# Altium footprint library ThanhNT.PcbLib: 579 footprints (part 2 of 37)
Each footprint in its own frame and in the unit in brackets; x right, y up, seen from the top. Pads: shape width x height; smd on the part's side, far side on the other; paste and mask are expansions set on the pad; w line width, h text height; cw(c..) or ccw(c..) is an arc to the next point about the centre after c.
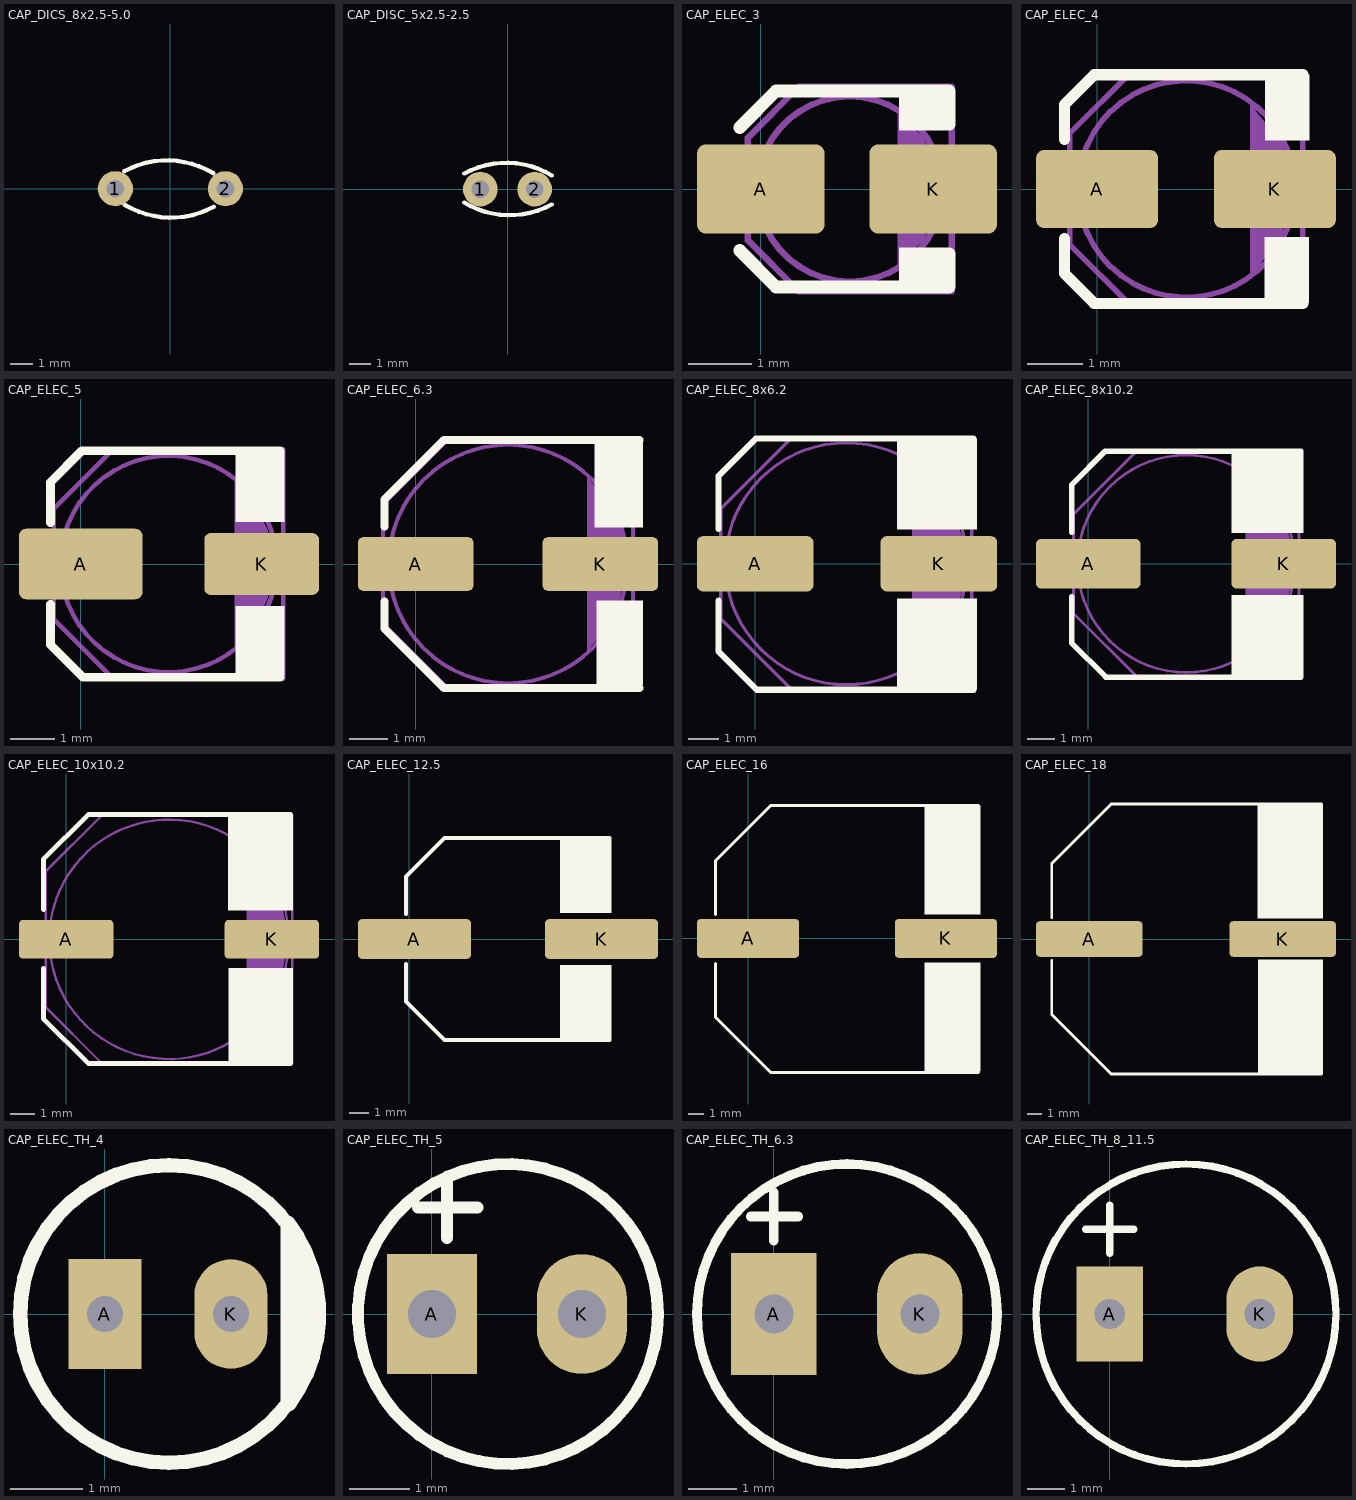
[diagram p1: the footprints below, top view; thin cyan lines are the x and y axes]

## CAP_DICS_8x2.5-5.0 [mm] "C Disc 5x2.5-5.0"
height 11
pads (2):
  round 1.6 hole 0.8: 1(-2.5,0) 2(2.5,0)
Top Overlay:
  lines w0.2: -2.088,0.796 cw(c-0.152,-2.769) 1.942,0.705 ; -2.069,-0.731 ccw(c0.025,2.743) 1.961,-0.822
3D body "User Library-Cer-Cap2_5 (5x1_5).STEP": height 2.24, standoff -5.76, extent -2.919,-1.566 2.868,1.618

## CAP_DISC_5x2.5-2.5 [mm] "C Disc 5x2.5-2.5"
height 5
pads (2):
  round 1.6 hole 0.8: 1(-1.25,0) 2(1.25,0)
Top Overlay:
  lines w0.2: -1.998,-0.62 ccw(c0.097,2.854) 2.032,-0.711 ; -1.986,0.72 cw(c-0.051,-2.845) 2.044,0.629
3D body "User Library-Cer-Cap2 (3_5x1_5).STEP": height 4.26, standoff -2.24, extent -1.905,-0.992 1.803,1.094

## CAP_ELEC_3 [mm] "Aluminum Cap SMD (Code A: 3mm)"
height 2.54
pads (2):
  rrect20% 2x1.4 smd: A(0,0) K(2.7,0)
Top Overlay:
  region: 2.962,-0.914 2.162,-0.914 2.162,-1.535 2.962,-1.535
  region: 2.962,1.535 2.162,1.535 2.162,0.914 2.962,0.914
  lines w0.2: -0.33,-0.965 0.239,-1.535 2.946,-1.535 2.946,-1.016 ; -0.33,0.965 0.239,1.535 2.946,1.535 2.946,1.016
Mechanical 16:
  circle w0.102: c1.393,0 r1.45
  region: -0.057,0.3 -0.407,0.3 -0.407,-0.3 -0.057,-0.3
  region: 3.193,0.3 2.843,0.3 2.843,-0.3 3.193,-0.3
  region: 2.243,-1.1 2.543,-0.8 2.743,-0.3 2.743,0.3 2.543,0.8 2.243,1.1 2.243,-1.05
  lines w0.102: 2.193,-1.2 2.193,1.2 ; -0.207,-0.8 -0.207,0.8 0.593,1.6 2.993,1.6 2.993,-1.6 0.593,-1.6 -0.207,-0.8

## CAP_ELEC_4 [mm] "Aluminum Cap SMD (Code B: 4mm)"
height 2.54
pads (2):
  rrect20% 2.2x1.4 smd: A(0,0) K(3.2,0)
Top Overlay:
  region: 3.823,2.057 3.023,2.057 3.023,0.873 3.823,0.873
  region: 3.81,-0.864 3.01,-0.864 3.01,-2.048 3.81,-2.048
  lines w0.2: -0.584,-0.889 -0.584,-1.524 -0.051,-2.057 3.708,-2.057 ; -0.584,0.889 -0.584,1.524 -0.051,2.057 -0.025,2.057 3.708,2.057
Mechanical 16:
  circle w0.102: c1.605,0 r1.95
  region: -0.295,0.35 -0.695,0.35 -0.695,-0.35 -0.295,-0.35
  region: 3.904,0.35 3.454,0.35 3.454,-0.35 3.904,-0.35
  region: 2.854,-1.45 3.305,-0.85 3.454,-0.35 3.454,0.4 3.305,0.85 2.854,1.4 2.854,-1.4
  lines w0.102: 2.804,-1.5 2.804,1.501 ; -0.496,-1 -0.496,1 0.605,2.1 3.705,2.1 3.705,-2.1 0.605,-2.1 -0.496,-1
3D body "User Library-SMD Polymer Aluminum Electrolytic Capacitors A5 10uF 10V.STEP": height 5.4, standoff -0.05, extent -0.9,-2.15 4.1,2.15

## CAP_ELEC_5 [mm] "Aluminum Cap SMD (Code C: 5mm)"
height 2.54
pads (2):
  rrect20% 2.8x1.6 smd: A(0,0)
  rrect20% 2.6x1.4 smd: K(4.1,0)
Top Overlay:
  region: 4.623,2.54 3.508,2.54 3.508,0.949 4.623,0.949
  region: 4.623,-0.949 3.508,-0.949 3.508,-2.515 4.623,-2.515
  lines w0.2: -0.686,-0.914 -0.686,-1.829 0.051,-2.565 4.521,-2.565 ; -0.686,0.94 -0.686,1.854 0.025,2.565 4.521,2.565
Mechanical 16:
  circle w0.102: c1.989,0 r2.45
  region: 4.939,0.35 4.389,0.35 4.389,-0.35 4.939,-0.35
  region: -0.411,0.35 -0.961,0.35 -0.961,-0.35 -0.411,-0.35
  region: 3.589,-1.8 3.989,-1.35 4.238,-0.75 4.439,-0.05 4.238,0.75 3.939,1.35 3.589,1.8
  lines w0.102: 3.538,-1.85 3.538,1.85 ; -0.611,-1.25 0.739,-2.6 4.589,-2.6 4.589,2.6 0.739,2.6 -0.611,1.25 -0.611,-1.25
3D body "User Library-SMD Polymer Aluminum Electrolytic Capacitors B6 33uF 10V.STEP": height 5.9, standoff -0.05, extent -0.993,-2.65 5.007,2.65

## CAP_ELEC_6.3 [mm] "Aluminum Cap SMD (Code D: 6.3mm)"
height 2.54
pads (2):
  rrect20% 3x1.4 smd: A(0,0) K(4.8,0)
Top Overlay:
  region: 5.908,-0.949 4.699,-0.949 4.699,-3.15 5.908,-3.15
  region: 5.908,3.2 4.648,3.2 4.648,0.949 5.908,0.949
  lines w0.2: -0.813,-0.965 -0.813,-1.676 0.737,-3.226 5.817,-3.226 ; -0.813,0.965 -0.813,1.676 0.737,3.226 5.817,3.226
Mechanical 16:
  circle w0.102: c2.401,0 r3.1
  region: -0.649,0.35 -1.249,0.35 -1.249,-0.35 -0.649,-0.35
  region: 6.051,0.35 5.451,0.35 5.451,-0.35 6.051,-0.35
  region: 4.551,-2.15 5,-1.6 5.3,-0.9 5.451,0 5.3,0.95 4.95,1.65 4.551,2.15 4.551,-2.1
  lines w0.102: 4.501,-2.25 4.501,2.2 ; -0.849,-1.55 -0.849,1.55 0.851,3.25 5.65,3.25 5.65,-3.25 0.851,-3.25 -0.849,-1.55
3D body "User Library-SMD Polymer Aluminum Electrolytic Capacitors C6 47uF 10V.STEP": height 5.9, standoff -0.05, extent -1.262,-3.3 6.038,3.3

## CAP_ELEC_8x6.2 [mm] "Aluminum Cap SMD (Code E: 8mm x 6.2mm)"
height 2.54
pads (2):
  rrect20% 3.8x1.8 smd: A(0,0) K(6,0)
Top Overlay:
  region: 7.239,4.089 4.626,4.089 4.626,1.118 7.239,1.118
  region: 7.239,-1.127 4.626,-1.127 4.626,-4.115 7.239,-4.115
  lines w0.2: -1.194,-1.194 -1.194,-2.87 0.051,-4.115 7.137,-4.115 ; -1.194,1.143 -1.194,2.87 0.025,4.089 7.137,4.089
Mechanical 16:
  circle w0.102: c2.975,0 r3.95
  region: 7.475,0.35 6.775,0.35 6.775,-0.35 7.475,-0.35
  region: -0.826,0.35 -1.526,0.35 -1.526,-0.35 -0.826,-0.35
  region: 5.225,-3.2 5.975,-2.5 6.575,-1.5 6.824,-0.65 6.824,0.65 6.524,1.6 5.925,2.55 5.225,3.2 5.225,-3.15
  lines w0.102: 5.174,-3.25 5.174,3.25 ; -1.125,-1.8 1.174,-4.1 7.075,-4.1 7.075,4.1 1.174,4.1 -1.125,1.8 -1.125,-1.8
3D body "User Library-SMD Polymer Aluminum Electrolytic Capacitors E7 56uF 16V.STEP": height 6.9, standoff -0.05, extent -1.503,-4.15 7.497,4.15

## CAP_ELEC_8x10.2 [mm] "Aluminum Cap SMD (Code E: 8mm x 10.2mm)"
height 2.54
pads (2):
  rrect20% 3.8x1.8 smd: A(0,0) K(7.1,0)
Top Overlay:
  region: 7.823,-1.127 5.21,-1.127 5.21,-4.115 7.823,-4.115
  region: 7.823,4.089 5.21,4.089 5.21,1.118 7.823,1.118
  lines w0.2: -0.61,-1.194 -0.61,-2.87 0.635,-4.115 7.722,-4.115 ; -0.61,1.143 -0.61,2.87 0.61,4.089 7.722,4.089
Mechanical 16:
  circle w0.102: c3.559,0 r3.95
  region: 8.059,0.35 7.359,0.35 7.359,-0.35 8.059,-0.35
  region: -0.241,0.35 -0.941,0.35 -0.941,-0.35 -0.241,-0.35
  region: 5.809,-3.2 6.559,-2.5 7.159,-1.5 7.409,-0.65 7.409,0.65 7.109,1.6 6.509,2.55 5.809,3.2 5.809,-3.15
  lines w0.102: 5.759,-3.25 5.759,3.25 ; -0.541,-1.8 -0.541,1.8 1.759,4.1 7.659,4.1 7.659,-4.1 1.759,-4.1 -0.541,-1.8
3D body "User Library-SMD Polymer Aluminum Electrolytic Capacitors E7 56uF 16V.STEP": height 6.9, standoff -0.05, extent -0.944,-4.15 8.056,4.15

## CAP_ELEC_10x10.2 [mm] "Aluminum Cap SMD (Code F: 10mm x 10.2mm)"
height 2.54
pads (2):
  rrect20% 3.9x1.6 smd: A(0,0) K(8.5,0)
Top Overlay:
  region: 9.373,-1.194 6.706,-1.194 6.706,-5.131 9.373,-5.131
  region: 9.373,5.156 6.68,5.156 6.68,1.194 9.373,1.194
  lines w0.2: -0.94,-1.194 -0.94,-3.277 0.914,-5.131 9.271,-5.131 ; -0.94,1.219 -0.94,3.302 0.914,5.156 9.271,5.156
Mechanical 16:
  circle w0.102: c4.25,0 r4.95
  region: 10.1,0.45 9.15,0.45 9.15,-0.45 10.1,-0.45
  region: -0.65,0.45 -1.6,0.45 -1.6,-0.45 -0.65,-0.45
  region: 7.55,-3.6 8.3,-2.75 8.9,-1.55 9.1,-0.45 9.1,0.45 8.9,1.55 8.3,2.75 7.55,3.6 7.55,-3.55
  lines w0.102: 7.5,-3.7 7.5,3.65 ; -0.85,-2.8 1.45,-5.1 9.35,-5.1 9.35,5.1 1.45,5.1 -0.85,2.8 -0.85,-2.8
3D body "User Library-SMD Polymer Aluminum Electrolytic Capacitors F12 560uF 10V.STEP": height 11.1, standoff -0.05, extent -1.258,-5.15 9.742,5.15

## CAP_ELEC_12.5 [mm] "Aluminum Cap SMD (Code G: 12.5mm)"
height 2.54
pads (2):
  rrect20% 5.7x2 smd: A(0.254,0) K(9.7,0)
Top Overlay:
  region: 10.211,5.105 7.595,5.105 7.595,1.319 10.211,1.319
  region: 10.211,-1.321 7.595,-1.321 7.595,-5.105 10.211,-5.105
  lines w0.2: -0.178,-1.27 -0.178,-3.15 1.778,-5.105 10.109,-5.105 ; -0.178,1.27 -0.178,3.15 1.778,5.105 10.109,5.105
3D body "User Library-SMD Polymer Aluminum Electrolytic Capacitors F12 560uF 10V.STEP": height 11.1, standoff -0.05, extent -0.547,-5.15 10.453,5.15

## CAP_ELEC_16 [mm] "Aluminum Cap SMD (Code J: 16mm)"
height 2.54
pads (2):
  rrect20% 6.5x2.5 smd: A(0,0) K(12.598,0)
Top Overlay:
  region: 14.783,-1.549 11.227,-1.549 11.227,-8.484 14.783,-8.484
  rectangle: 11.227,1.524 14.783,8.458
  lines w0.2: -2.083,-1.6 -2.083,-5.004 1.448,-8.534 14.681,-8.534 ; -2.083,1.524 -2.083,4.928 1.448,8.458 14.681,8.458
3D body "SW3dPS-capacitor size J16.STEP": height 16.5, standoff -0.01, extent -2.5,-8.525 15.2,8.475

## CAP_ELEC_18 [mm] "Aluminum Cap SMD (Code K: 18mm)"
height 2.54
pads (2):
  rrect20% 7.5x2.5 smd: A(0,0) K(13.614,0)
Top Overlay:
  region: 16.434,9.5 11.836,9.5 11.836,1.448 16.434,1.448
  rectangle: 11.862,-9.5 16.459,-1.448
  lines w0.2: -2.642,-1.524 -2.642,-5.309 1.549,-9.5 16.332,-9.5 ; -2.642,1.524 -2.642,5.309 1.549,9.5 16.332,9.5
3D body "SW3dPS-capacitor size K16.STEP": height 16.5, standoff -0.01, extent -3.243,-9.5 16.857,9.5

## CAP_ELEC_TH_4 [mil] "CAP Radial 4mm"
pads (2):
  rect 40x60 hole 19.68: A(0,0)
  oval 40x60 hole 19.68: K(68.9,0)
Top Overlay:
  circle w7.87: c35,0 r81.39
  region: 100.48,-49.36 104.51,-44.03 110.72,-32.18 114.94,-19.49 117.04,-6.29 116.97,7.09 114.74,20.27 110.41,32.92 104.08,44.7 100,50
  lines w7.87: 100,-49 100,50 cw(c35,0) 100.48,-49.36
3D body "User Library-Cap-EL(4x6-1_5)T.STEP": height 248.11, standoff -129.92, extent -44.74,-79.71 112.82,77.72

## CAP_ELEC_TH_5 [mm] "Radial Capacitor (Code B: 5mm)"
pads (2):
  rect 1.5x2 hole 0.8: A(0,0)
  oval 1.5x2 hole 0.8: K(2.5,0)
Top Overlay:
  circle w0.2: c1.27,0 r2.5
  lines w0.2: -0.229,1.778 0.762,1.778 ; 0.254,1.27 0.254,2.286
3D body "User Library-Cap-EL(5x11-2)T.STEP": height 2.16, standoff -11.64, extent -1.23,-2.473 3.772,2.524

## CAP_ELEC_TH_6.3 [mil] "Radial Capacitor (Code C: 6.3mm)"
pads (2):
  rect 70x100 hole 32: A(0,0)
  oval 70x100 hole 32: K(119.69,0)
Top Overlay:
  circle w7.87: c60,0 r123.03
  lines w7.87: -19,80 20,80 ; 0,60 0,100
3D body "User Library-Cap-EL(6_3x12-2_5).STEP": height 472.52, standoff -125.98, extent -65.01,-124 183.1,124.01

## CAP_ELEC_TH_8_11.5 [mil] "Radial Capacitor (Code E: 8mm)"
pads (2):
  rect 70x100 hole 32: A(0,0)
  oval 70x100 hole 32: K(157.48,0)
Top Overlay:
  circle w7.87: c80,0 r157.48
  lines w7.87: -25,89 25,89 ; 0,64 0,114
3D body "User Library-Cap-EL(8x11_5-3_5).STEP": height 452.83, standoff -129.92, extent -79.47,-157.47 235.57,157.48